# Altium footprint library MCU.PcbLib: 87 footprints (part 4 of 6)
Each footprint in its own frame and in the unit in brackets; x right, y up, seen from the top. Pads: shape width x height; smd on the part's side, far side on the other; paste and mask are expansions set on the pad; w line width, h text height; cw(c..) or ccw(c..) is an arc to the next point about the centre after c.
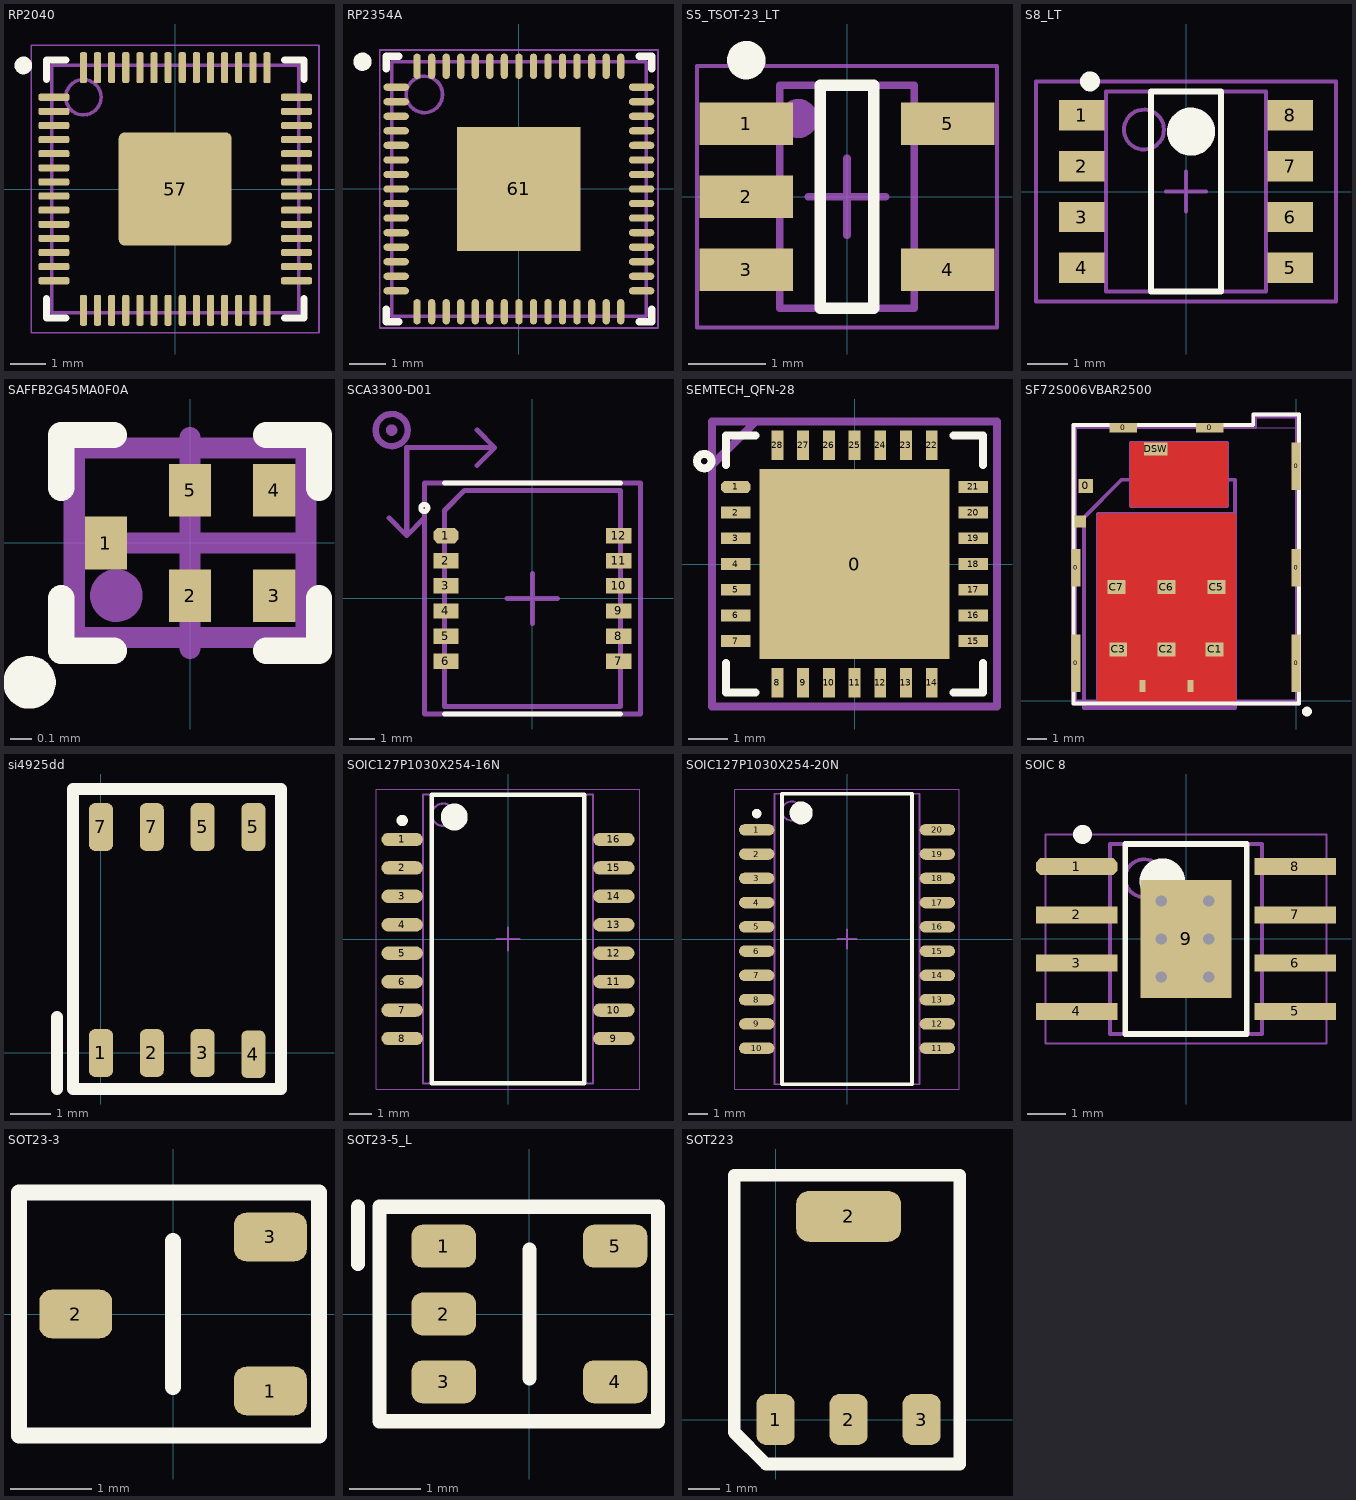
[diagram p3: the footprints below, top view; thin cyan lines are the x and y axes]

## RP2040 [mm]
height 0.9
pads (57):
  rrect50% 0.875x0.2 smd: 1(-3.437,2.6) 2(-3.437,2.2) 3(-3.437,1.8) 4(-3.437,1.4) 5(-3.437,1) 6(-3.437,0.6) 7(-3.437,0.2) 8(-3.437,-0.2) 9(-3.437,-0.6) 10(-3.437,-1) 11(-3.437,-1.4) 12(-3.437,-1.8) 13(-3.437,-2.2) 14(-3.437,-2.6) 29(3.437,-2.6) 30(3.437,-2.2) 31(3.437,-1.8) 32(3.437,-1.4) 33(3.437,-1) 34(3.437,-0.6) 35(3.437,-0.2) 36(3.437,0.2) 37(3.437,0.6) 38(3.437,1) 39(3.437,1.4) 40(3.437,1.8) 41(3.437,2.2) 42(3.437,2.6)
  rrect50% 0.2x0.875 smd: 15(-2.6,-3.437) 16(-2.2,-3.437) 17(-1.8,-3.437) 18(-1.4,-3.437) 19(-1,-3.437) 20(-0.6,-3.437) 21(-0.2,-3.437) 22(0.2,-3.437) 23(0.6,-3.437) 24(1,-3.437) 25(1.4,-3.437) 26(1.8,-3.437) 27(2.2,-3.437) 28(2.6,-3.437) 43(2.6,3.437) 44(2.2,3.437) 45(1.8,3.437) 46(1.4,3.437) 47(1,3.437) 48(0.6,3.437) 49(0.2,3.437) 50(-0.2,3.437) 51(-0.6,3.437) 52(-1,3.437) 53(-1.4,3.437) 54(-1.8,3.437) 55(-2.2,3.437) 56(-2.6,3.437)
  rrect10% 3.2x3.2 smd: 57(0,0)
Top Overlay:
  circle w0.25: c-4.3,3.5 r0.125
  lines w0.2: -3.65,-3.1 -3.65,-3.65 -3.1,-3.65 ; -3.65,3.1 -3.65,3.65 -3.1,3.65 ; 3.1,-3.65 3.65,-3.65 3.65,-3.1 ; 3.1,3.65 3.65,3.65 3.65,3.1
Mechanical 7:
  text ".Designator" at -1.045,-0.066 h0.38
Mechanical 13:
  circle w0.1: c-2.6,2.6 r0.5
  lines w0.1: -3.5,-3.5 3.5,-3.5 3.5,3.5 -3.5,3.5 -3.5,-3.5
Mechanical 15:
  lines w0.05: -4.075,-4.075 4.075,-4.075 4.075,4.075 -4.075,4.075 -4.075,-4.075
  lines w0.1: -0.5,0 0.5,0 ; 0,-0.5 0,0.5
3D body "RP2040.step": height 0.9, standoff 0, extent -3.501,-3.501 3.501,3.501

## RP2354A [mm] "QFN, 60-Leads, Body 7.00x7.00mm, Pitch 0.40mm, Thermal Pad 3.40x3.40mm, IPC High Density"
height 0.9
pads (61):
  oval 0.7x0.2 smd: 1(-3.375,2.8) 2(-3.375,2.4) 3(-3.375,2) 4(-3.375,1.6) 5(-3.375,1.2) 6(-3.375,0.8) 7(-3.375,0.4) 8(-3.375,0) 9(-3.375,-0.4) 10(-3.375,-0.8) 11(-3.375,-1.2) 12(-3.375,-1.6) 13(-3.375,-2) 14(-3.375,-2.4) 15(-3.375,-2.8) 31(3.375,-2.8) 32(3.375,-2.4) 33(3.375,-2) 34(3.375,-1.6) 35(3.375,-1.2) 36(3.375,-0.8) 37(3.375,-0.4) 38(3.375,0) 39(3.375,0.4) 40(3.375,0.8) 41(3.375,1.2) 42(3.375,1.6) 43(3.375,2) 44(3.375,2.4) 45(3.375,2.8)
  oval 0.2x0.7 smd: 16(-2.8,-3.375) 17(-2.4,-3.375) 18(-2,-3.375) 19(-1.6,-3.375) 20(-1.2,-3.375) 21(-0.8,-3.375) 22(-0.4,-3.375) 23(0,-3.375) 24(0.4,-3.375) 25(0.8,-3.375) 26(1.2,-3.375) 27(1.6,-3.375) 28(2,-3.375) 29(2.4,-3.375) 30(2.8,-3.375) 46(2.8,3.375) 47(2.4,3.375) 48(2,3.375) 49(1.6,3.375) 50(1.2,3.375) 51(0.8,3.375) 52(0.4,3.375) 53(0,3.375) 54(-0.4,3.375) 55(-0.8,3.375) 56(-1.2,3.375) 57(-1.6,3.375) 58(-2,3.375) 59(-2.4,3.375) 60(-2.8,3.375)
  rect 3.4x3.4 smd: 61(0,0)
Top Overlay:
  circle w0.25: c-4.3,3.5 r0.125
  lines w0.2: -3.65,-3.3 -3.65,-3.65 -3.3,-3.65 ; -3.65,3.3 -3.65,3.65 -3.3,3.65 ; 3.3,-3.65 3.65,-3.65 3.65,-3.3 ; 3.3,3.65 3.65,3.65 3.65,3.3
Mechanical 13:
  circle w0.1: c-2.6,2.6 r0.5
  lines w0.1: -3.5,-3.5 3.5,-3.5 3.5,3.5 -3.5,3.5 -3.5,-3.5
Mechanical 15:
  lines w0.05: -3.825,-3.825 3.825,-3.825 3.825,3.825 -3.825,3.825 -3.825,-3.825
  lines w0.1: -0.5,0 0.5,0 ; 0,-0.5 0,0.5
3D body "RP2350_QFN60.step": height 0.9, standoff -0.05, extent -3.5,-3.5 3.5,3.5

## S5_TSOT-23_LT [mm]
pads (5):
  rect 1.22x0.55 smd: 1(-1.31,0.95) 2(-1.31,0) 3(-1.31,-0.95) 4(1.31,-0.95) 5(1.31,0.95)
Top Overlay:
  circle w0.25: c-1.31,1.775 r0.125
  lines w0.15: -0.35,-1.45 0.35,-1.45 0.35,1.45 -0.35,1.45 -0.35,-1.45
Mechanical 15:
  lines w0.05: -1.95,-1.7 -1.95,1.7 1.95,1.7 1.95,-1.7 -1.95,-1.7
  lines w0.1: -0.5,0 0.5,0 ; 0,-0.5 0,0.5
Mechanical 17:
  circle w0.254: c-0.635,1.016 r0.127
  lines w0.1: -0.875,-1.45 -0.875,1.45 0.875,1.45 0.875,-1.45 -0.875,-1.45
  text ".Designator" at -0.635,-0.381 h0.4
3D body: height 1, standoff 0.01, extent -0.875,-1.45 0.875,1.45

## S8_LT [mil]
pads (8):
  rect 45x30 smd: 1(-102.5,75) 2(-102.5,25) 3(-102.5,-25) 4(-102.5,-75) 5(102.5,-75) 6(102.5,-25) 7(102.5,25) 8(102.5,75)
Top Overlay:
  circle w9.84: c-94.49,108.46 r4.92
  circle w23.62: c4.92,59.06 r11.81
  lines w5.91: -34.45,-98.43 -34.45,98.43 34.45,98.43 34.45,-98.43 -34.45,-98.43
Mechanical 15:
  lines w3.94: -19.68,0 19.68,0 ; 0,-19.68 0,19.68 ; -147.64,-108.27 -147.64,108.27 147.64,108.27 147.64,-108.27 -147.64,-108.27
Mechanical 17:
  circle w3.94: c-41.34,61.02 r19.68
  lines w3.94: -78.74,-98.43 -78.74,98.43 78.74,98.43 78.74,-98.43 -78.74,-98.43
  text ".Designator" at -65,-55 h31.5
3D body "so8-3.step": height 66.93, standoff 0, extent -118.11,-96.45 118.11,96.46

## SAFFB2G45MA0F0A [mm]
pads (5):
  rect 0.2x0.25 smd: 1(-0.4,0) 2(0,-0.25) 3(0.4,-0.25) 4(0.4,0.25) 5(0,0.25)
Top Overlay:
  circle w0.15: c-0.762,-0.662 r0.05
  lines w0.125: -0.613,-0.262 -0.613,-0.512 -0.362,-0.512 ; -0.613,0.262 -0.613,0.512 -0.362,0.512 ; 0.362,-0.512 0.613,-0.512 0.613,-0.262 ; 0.362,0.512 0.613,0.512 0.613,0.262
Mechanical 7:
  circle w0.15: c-0.35,-0.25 r0.05
  lines w0.1: -0.55,-0.45 0.55,-0.45 0.55,0.45 -0.55,0.45 -0.55,-0.45
  text ".Designator" at -0.4,0 h0.3
Mechanical 15:
  lines w0.05: -0.55,-0.45 -0.55,0.45 0.55,0.45 0.55,-0.45 -0.55,-0.45
  lines w0.1: -0.5,0 0.5,0 ; 0,-0.5 0,0.5
3D body: height 0.5, standoff 0, extent -0.55,-0.45 0.55,0.45

## SCA3300-D01 [mm]
pads (12):
  oct 1x0.61 smd: 1(-3.44,2.5)
  rect 1x0.61 smd: 2(-3.44,1.5) 3(-3.44,0.5) 4(-3.44,-0.5) 5(-3.44,-1.5) 6(-3.44,-2.5) 7(3.44,-2.5) 8(3.44,-1.5) 9(3.44,-0.5) 10(3.44,0.5) 11(3.44,1.5) 12(3.44,2.5)
Top Overlay:
  circle w0.2: c-4.3,3.6 r0.141
  lines w0.2: -3.5,-4.6 3.5,-4.6 ; -3.5,4.6 3.5,4.6
Mechanical 15:
  lines w0.2: -1,0 1,0 ; 0,-1 0,1 ; -4.3,-4.6 4.3,-4.6 4.3,4.6 -4.3,4.6 -4.3,-4.6
Mechanical 16:
  circle w0.254: c-5.6,6.7 r0.1
  circle w0.254: c-5.6,6.7 r0.64
  lines w0.2: -5.7,3.2 -5,2.5 ; -4.3,3.2 -5,2.5 ; -2.2,5.3 -1.5,6 ; -2.2,6.7 -1.5,6 ; -5,2.5 -5,6 -1.5,6 ; -5,2.5 -5,2.5 ; -5,2.5 -5,2.5 ; -1.5,6 -1.5,6 ; -1.5,6 -1.5,6 ; -3.5,-4.3 3.5,-4.3 3.5,4.3 -2.7,4.3 -3.5,3.5 -3.5,-4.3
Mechanical 17:
  text "z" at -4.5,7.5 h1.5
  text "y" at -5.5,1.9 h1.5
  text "x" at -0.9,6.5 h1.5
  text "'.Designator'" at -0.5,4 h1.5
3D body: height 3.4, standoff -0.01, extent -3.5,-4.3 3.5,4.3

## SEMTECH_QFN-28 [mm]
pads (29):
  rect 4.8x4.8 smd paste-2.5 mask+0.07: 0(0,0)
  oct 0.75x0.3 smd mask+0.07: 1(-3,1.95)
  rect 0.75x0.3 smd mask+0.07: 2(-3,1.3) 3(-3,0.65) 4(-3,0) 5(-3,-0.65) 6(-3,-1.3) 7(-3,-1.95) 15(3,-1.95) 16(3,-1.3) 17(3,-0.65) 18(3,0) 19(3,0.65) 20(3,1.3) 21(3,1.95)
  rect 0.3x0.75 smd mask+0.07: 8(-1.95,-3) 9(-1.3,-3) 10(-0.65,-3) 11(0,-3) 12(0.65,-3) 13(1.3,-3) 14(1.95,-3) 22(1.95,3) 23(1.3,3) 24(0.65,3) 25(0,3) 26(-0.65,3) 27(-1.3,3) 28(-1.95,3)
Top Overlay:
  circle w0.2: c-3.8,2.6 r0.182
  lines w0.2: -3.25,-2.5 -3.25,-3.25 -2.5,-3.25 ; -3.25,2.5 -3.25,3.25 -2.5,3.25 ; 2.5,-3.25 3.25,-3.25 3.25,-2.5 ; 2.5,3.25 3.25,3.25 3.25,2.5
Top Paste:
  rectangle: 0.225,0.225 1.725,1.725
  rectangle: 0.225,-1.725 1.725,-0.225
  rectangle: -1.725,-1.725 -0.225,-0.225
  rectangle: -1.725,0.225 -0.225,1.725
Mechanical 15:
  lines w0.2: -0.6,-0.6 0.6,0.6 ; -0.6,0.6 0.6,-0.6 ; -3.6,-3.6 3.6,-3.6 3.6,3.6 -3.6,3.6 -3.6,-3.6
Mechanical 16:
  lines w0.2: -3.6,-3.6 3.6,-3.6 3.6,3.6 -2.5,3.6 -3.6,2.5 -3.6,-3.6
Mechanical 17:
  text "'.Designator'" at -3.2,-0.9 h1.5
3D body "QFN 28-Pin 0_65mm Pitch.step": height 1, standoff 0, extent -3.01,-3.01 3.01,3.01

## SF72S006VBAR2500 [mm]
pads (18):
  rect 0.45x2.9 smd: 0(-11.175,1.9) 0(0,1.9)
  rect 0.45x1.9 smd: 0(-11.175,6.75) 0(0,6.75)
  rect 0.75x0.7 smd: 0(-10.675,10.9)
  rect 1.4x0.5 smd: 0(-8.78,13.85) 0(-4.38,13.85)
  rect 0.3x0.6 smd: 0(-7.8,0.75) 0(-5.36,0.75)
  rect 0.45x2.4 smd: 0(0,11.9)
  rect 0.9x0.7 smd: C1(-4.14,2.6) C2(-6.58,2.6) C3(-9.02,2.6) C5(-4.04,5.77) C6(-6.58,5.77) C7(-9.12,5.77)
  rect 0.6x0.6 smd: CSW(-10.95,9.1)
  rect 1.2x0.65 smd: DSW(-7.13,12.775)
Top Layer:
  pour cut-out: -8.407,13.106 -3.48,13.106 -3.48,9.855 -8.407,9.855
  pour cut-out: -10.084,9.5 -3.073,9.5 -3.073,-0.025 -10.084,-0.025
Top Overlay:
  lines w0.2: -11.3,-0.15 0.15,-0.15 0.15,14.525 -2.175,14.525 -2.175,14 -11.3,14 -11.3,-0.15
  lines w0.25: 0.443,-0.486 ccw(c0.55,-0.55) 0.462,-0.462
Mechanical 7:
  lines w0.2: -3.124,11.214 -8.852,11.214 -10.77,9.296 -10.77,-0.381 -3.099,-0.381 -3.099,11.214 ; -11.3,-0.15 -11.3,14 -2.175,14 -2.175,14.525 0.15,14.525 0.15,-0.15 -11.3,-0.15
  text ".Designator" at -10.414,12.192 h1.02
Mechanical 13:
  lines w0.1: -11.175,0 0,0 0,14.375 -2.025,14.375 -2.025,13.85 -11.175,13.85 -11.175,0
Mechanical 15:
  lines w0.05: -11.175,0 0,0 0,13.85 -11.175,13.85 -11.175,0
  lines w0.15: -5.16,0 -10.08,0 -10.08,9.5 -3.08,9.5 -3.08,0 ; -8.4,9.85 -8.4,13.1 -3.48,13.1 -3.48,9.85 -8.4,9.85
  text "NO VIA" at -8.128,11.938 h0.8
  text "NO VIA" at -8.93,7.84 h0.8
  text "NO TRACE" at -8.89,10.668 h0.8
  text "NO TRACE" at -9.652,6.604 h0.8
3D body "K3D-SF72S006VBA-V2_JAE_Proprietary.STEP": height 1.25, standoff 0, extent -11.2,0.05 0.02,14.4

## si4925dd [mm] "Dual Mosfet"
pads (8):
  rrect50% 0.599x1.194 smd: 1(0,0) 2(1.27,0) 3(2.54,0) 4(3.81,-0.031) 5(2.54,5.651) 5(3.81,5.651) 7(0,5.651) 7(1.27,5.651)
Top Overlay:
  lines w0.3: -1.1,-0.9 -1.1,0.9 ; -0.7,-0.9 -0.7,6.6 4.5,6.6 4.5,-0.9 -0.7,-0.9
3D body "SI4925DDY-T1-GE3.STEP": height 1.75, standoff 0, extent -0.55,-0.15 4.35,5.85

## SOIC8 [mm]
3D body "SOIC8.STEP": height 1.75, standoff 0, extent -2.997,-2.451 2.997,2.451

## SOIC127P1030X254-16N [mm] "SOIC, 16-Leads, Body 12.75x7.50mm, Pitch 1.27mm, IPC Medium Density"
height 2.54
pads (16):
  oval 1.85x0.6 smd: 1(-4.725,4.445) 2(-4.725,3.175) 3(-4.725,1.905) 4(-4.725,0.635) 5(-4.725,-0.635) 6(-4.725,-1.905) 7(-4.725,-3.175) 8(-4.725,-4.445) 9(4.725,-4.445) 10(4.725,-3.175) 11(4.725,-1.905) 12(4.725,-0.635) 13(4.725,0.635) 14(4.725,1.905) 15(4.725,3.175) 16(4.725,4.445)
Top Overlay:
  circle w0.6: c-2.4,5.45 r0.3
  circle w0.25: c-4.725,5.295 r0.125
  lines w0.2: -3.4,-6.45 3.4,-6.45 3.4,6.45 -3.4,6.45 -3.4,-6.45
Mechanical 13:
  circle w0.1: c-2.9,5.55 r0.5
  lines w0.1: -3.8,-6.45 3.8,-6.45 3.8,6.45 -3.8,6.45 -3.8,-6.45
Mechanical 15:
  lines w0.05: -5.875,-6.7 5.875,-6.7 5.875,6.7 -5.875,6.7 -5.875,-6.7
  lines w0.1: -0.5,0 0.5,0 ; 0,-0.5 0,0.5
3D body "SOIC16 wide.stp": height 2, standoff 0, extent -5.082,-5.04 5.081,5.04

## SOIC127P1030X254-20N [mm] "SOIC, 20-Leads, Body 15.30x7.50mm, Pitch 1.27mm, IPC Medium Density"
height 2.54
pads (20):
  oval 1.85x0.6 smd: 1(-4.725,5.715) 2(-4.725,4.445) 3(-4.725,3.175) 4(-4.725,1.905) 5(-4.725,0.635) 6(-4.725,-0.635) 7(-4.725,-1.905) 8(-4.725,-3.175) 9(-4.725,-4.445) 10(-4.725,-5.715) 11(4.725,-5.715) 12(4.725,-4.445) 13(4.725,-3.175) 14(4.725,-1.905) 15(4.725,-0.635) 16(4.725,0.635) 17(4.725,1.905) 18(4.725,3.175) 19(4.725,4.445) 20(4.725,5.715)
Top Overlay:
  circle w0.25: c-4.725,6.565 r0.125
  circle w0.6: c-2.4,6.6 r0.3
  lines w0.2: -3.4,-7.6 -3.4,7.6 3.4,7.6 3.4,-7.6 -3.4,-7.6
Mechanical 13:
  circle w0.1: c-2.9,6.7 r0.5
  lines w0.1: -3.8,-7.6 -3.8,7.6 3.8,7.6 3.8,-7.6 -3.8,-7.6
Mechanical 15:
  lines w0.05: -5.875,-7.85 -5.875,7.85 5.875,7.85 5.875,-7.85 -5.875,-7.85
  lines w0.1: -0.5,0 0.5,0 ; 0,-0.5 0,0.5
3D body "SOIC20 wide.stp": height 2, standoff 0, extent -5.082,-6.5 5.081,6.5

## SOIC 8 [mm]
pads (9):
  oct 2.15x0.45 smd: 1(-2.875,1.905)
  rect 2.15x0.45 smd: 2(-2.875,0.635) 3(-2.875,-0.635) 4(-2.875,-1.905) 5(2.875,-1.905) 6(2.875,-0.635) 7(2.875,0.635) 8(2.875,1.905)
  rect 2.4x3.1 smd: 9(0,0)
via 0.6,-1 diameter 0.6 hole 0.3
via 0.6,0 diameter 0.6 hole 0.3
via 0.6,1 diameter 0.6 hole 0.3
via -0.65,-1 diameter 0.6 hole 0.3
via -0.65,0 diameter 0.6 hole 0.3
via -0.65,1 diameter 0.6 hole 0.3
Top Overlay:
  circle w0.25: c-2.725,2.755 r0.125
  circle w0.6: c-0.625,1.525 r0.3
  lines w0.15: -1.6,-2.5 -1.6,2.5 1.6,2.5 1.6,-2.5 -1.6,-2.5
Mechanical 15:
  lines w0.05: -3.7,-2.75 -3.7,2.75 3.7,2.75 3.7,-2.75 -3.7,-2.75
  lines w0.1: -0.5,0 0.5,0 ; 0,-0.5 0,0.5
Mechanical 17:
  circle w0.1: c-1.1,1.6 r0.5
  lines w0.1: -2,-2.5 -2,2.5 2,2.5 2,-2.5 -2,-2.5
  text ".Designator" at -1.27,-1.27 h1.2
3D body "SOIC127P600-8N2.step": height 1.75, standoff 0, extent -3,-2.5 3,2.5

## SOT23-3 [mm] "SOT23, 5-Leads, Body 2.95x2.80mm, Pitch 0.95mm, IPC High Density"
height 1.45
pads (3):
  rrect50% 0.9x0.6 smd: 1(1.2,-0.95) 2(-1.2,0) 3(1.2,0.95)
Top Overlay:
  lines w0.2: 0,-0.9 0,0.9 ; -1.9,-1.5 1.8,-1.5 1.8,1.5 -1.9,1.5 -1.9,-1.5
3D body "SOT23-5.stp": height 1.2, standoff 0.02, extent -1.418,-1.5 1.418,1.5

## SOT23-5_L [mm] "SOT23, 5-Leads, Body 2.95x2.80mm, Pitch 0.95mm, IPC High Density"
height 1.45
pads (5):
  rrect50% 0.9x0.6 smd: 1(-1.2,0.95) 2(-1.2,0) 3(-1.2,-0.95) 4(1.2,-0.95) 5(1.2,0.95)
Top Overlay:
  lines w0.2: -2.4,0.7 -2.4,1.5 ; 0,-0.9 0,0.9 ; -2.1,-1.5 -2.1,1.5 1.8,1.5 1.8,-1.5 -2.1,-1.5
3D body "SOT23-5.stp": height 1.2, standoff 0.02, extent -1.418,-1.5 1.418,1.5

## SOT223 [mm] "SOT223, Pitch 0.95mm, IPC High Density"
height 1.45
pads (4):
  rrect50% 1.2x1.6 smd: 1(0,0) 2(2.3,0) 3(4.6,0)
  rrect50% 3.3x1.6 smd: 2(2.3,6.4)
Top Overlay:
  lines w0.4: -1.3,-0.4 -0.3,-1.4 5.8,-1.4 5.8,7.7 -1.3,7.7 -1.3,-0.4
3D body "SOT-223.SLDPRT": height 1.6, standoff -0.1, extent -0.9,-0.445 5.6,6.446